# Altium footprint library PcbLib1.PcbLib: 136 footprints (part 7 of 9)
Each footprint in its own frame and in the unit in brackets; x right, y up, seen from the top. Pads: shape width x height; smd on the part's side, far side on the other; paste and mask are expansions set on the pad; w line width, h text height; cw(c..) or ccw(c..) is an arc to the next point about the centre after c.
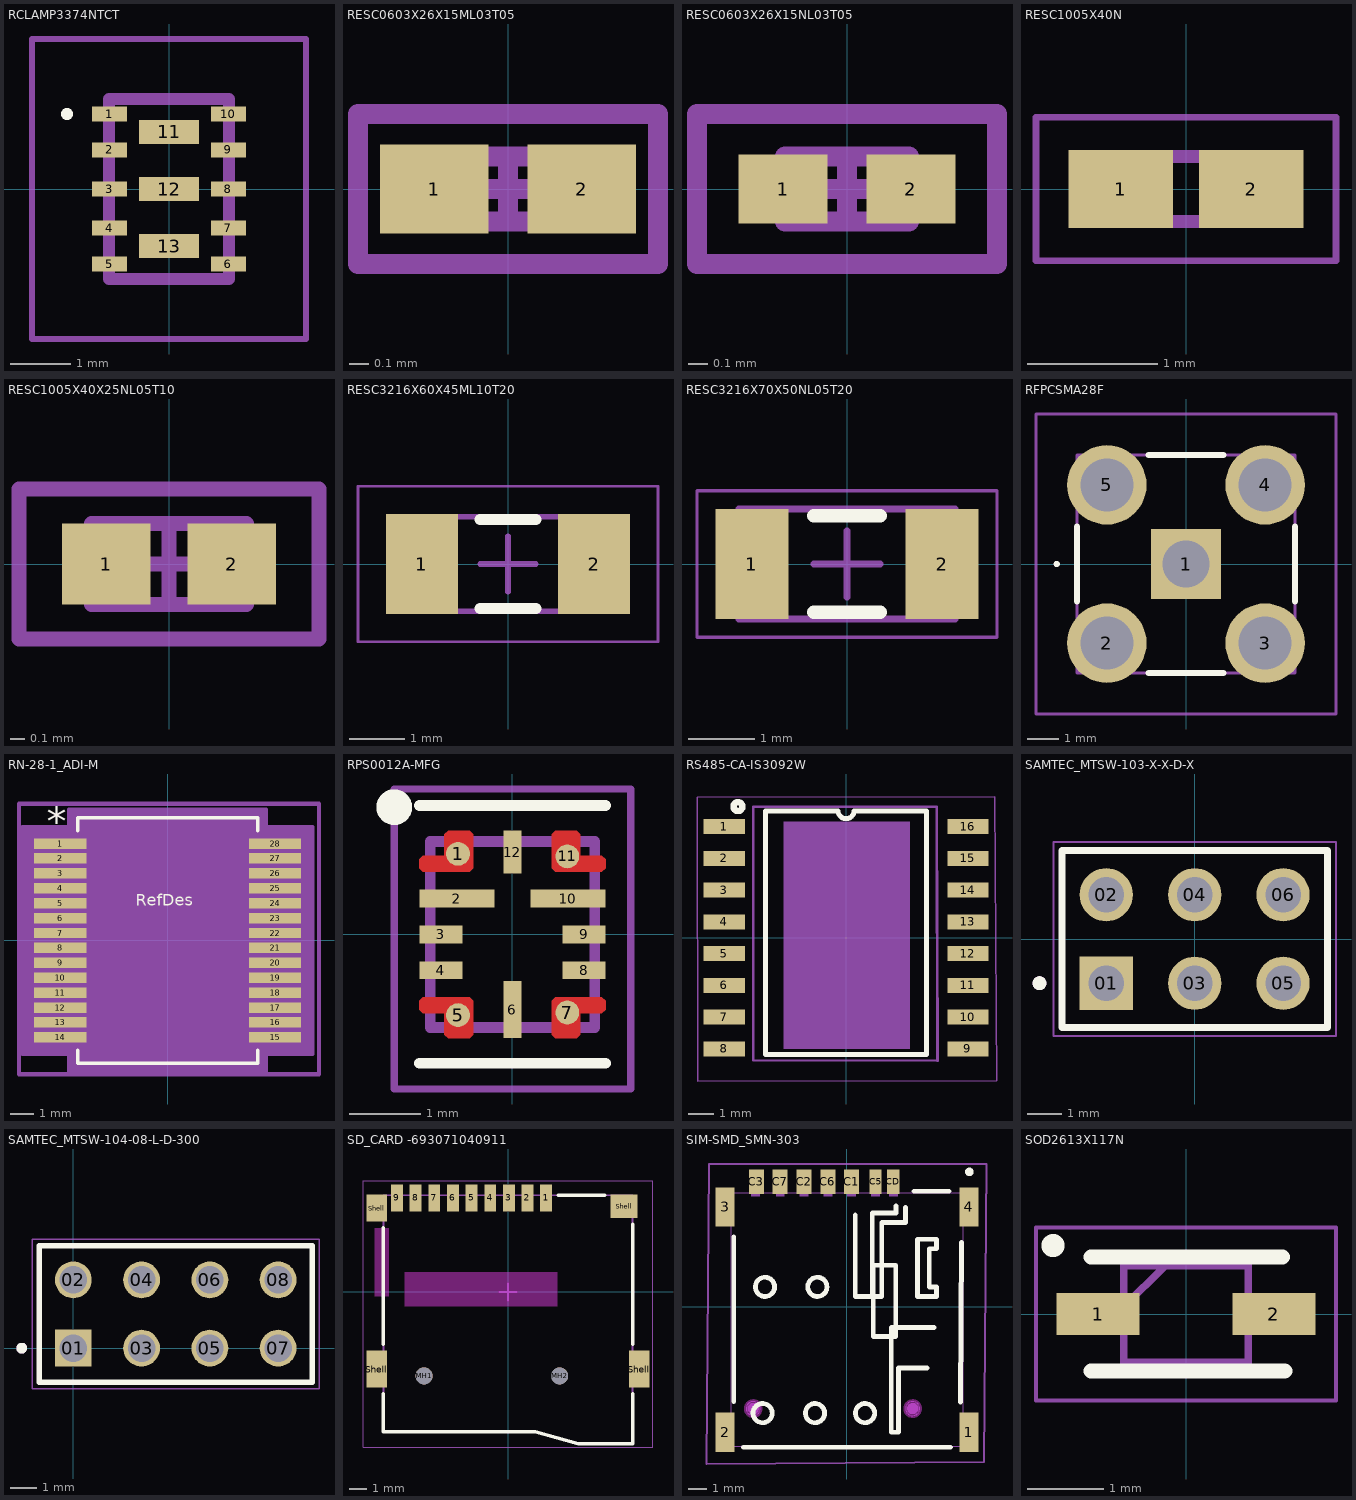
[diagram p6: the footprints below, top view; thin cyan lines are the x and y axes]

## RCLAMP3374NTCT [mm]
pads (13):
  rect 0.58x0.25 smd: 1(-0.99,1.25) 2(-0.99,0.65) 3(-0.99,0) 4(-0.99,-0.65) 5(-0.99,-1.25) 6(0.99,-1.25) 7(0.99,-0.65) 8(0.99,0) 9(0.99,0.65) 10(0.99,1.25)
  rect 1x0.4 smd: 11(0,0.95) 12(0,0) 13(0,-0.95)
Top Overlay:
  lines w0.1: -1.7,1.2 ccw(c-1.7,1.25) -1.7,1.3 ccw(c-1.7,1.25) -1.7,1.2
Mechanical 13:
  lines w0.2: -1,-1.5 1,-1.5 1,1.5 -1,1.5 -1,-1.5
Mechanical 15:
  lines w0.1: -2.28,-2.5 2.28,-2.5 2.28,2.5 -2.28,2.5 -2.28,-2.5
3D body "RCLAMP3374N.TCT.stp": height 0.61, standoff 0.01, extent -1,-1.5 1,1.5

## RESC0603X26X15ML03T05 [mm]
pads (2):
  rect 0.55x0.45 smd: 1(-0.375,0) 2(0.375,0)
Top Courtyard:
  lines w0.1: -0.165,0 0.165,0 ; 0,-0.165 0,0.165
Top 3D Body:
  lines w0.1: -0.315,-0.165 -0.315,0.165 0.315,0.165 0.315,-0.165 -0.315,-0.165
Mechanical 15:
  lines w0.101: -0.762,-0.381 0.762,-0.381 0.762,0.381 -0.762,0.381 -0.762,-0.381
3D body: height 0.26, standoff 0, extent -0.165,-0.165 0.165,0.165
3D body: height 0.26, standoff 0, extent -0.315,-0.165 -0.165,0.165
3D body: height 0.26, standoff 0, extent 0.165,-0.165 0.315,0.165

## RESC0603X26X15NL03T05 [mm]
pads (2):
  rect 0.45x0.35 smd: 1(-0.325,0) 2(0.325,0)
Top Courtyard:
  lines w0.1: -0.165,0 0.165,0 ; 0,-0.165 0,0.165
Top 3D Body:
  lines w0.1: -0.315,-0.165 0.315,-0.165 0.315,0.165 -0.315,0.165 -0.315,-0.165
Mechanical 15:
  lines w0.101: -0.762,-0.381 -0.762,0.381 0.762,0.381 0.762,-0.381 -0.762,-0.381
3D body: height 0.26, standoff 0, extent 0.165,-0.165 0.315,0.165
3D body: height 0.26, standoff 0, extent -0.315,-0.165 -0.165,0.165
3D body: height 0.26, standoff 0, extent -0.165,-0.165 0.165,0.165

## RESC1005X40N [mm]
pads (2):
  rect 0.8x0.6 smd: 1(-0.5,0) 2(0.5,0)
Mechanical 13:
  lines w0.1: -0.5,-0.25 0.5,-0.25 0.5,0.25 -0.5,0.25 -0.5,-0.25
Mechanical 15:
  lines w0.05: -1.15,-0.55 1.15,-0.55 1.15,0.55 -1.15,0.55 -1.15,-0.55
3D body "RMCF0402ZT0R00.stp": height 0.3, standoff 0, extent -0.504,-0.246 0.496,0.254

## RESC1005X40X25NL05T10 [mm]
pads (2):
  rect 0.6x0.55 smd: 1(-0.425,0) 2(0.425,0)
Top Courtyard:
  lines w0.1: -0.275,0 0.275,0 ; 0,-0.275 0,0.275
Top 3D Body:
  lines w0.1: -0.525,-0.275 -0.525,0.275 0.525,0.275 0.525,-0.275 -0.525,-0.275
Mechanical 15:
  lines w0.101: -1.016,-0.508 1.016,-0.508 1.016,0.508 -1.016,0.508 -1.016,-0.508
3D body: height 0.4, standoff 0, extent -0.275,-0.275 0.275,0.275
3D body: height 0.4, standoff 0, extent -0.525,-0.275 -0.275,0.275
3D body: height 0.4, standoff 0, extent 0.275,-0.275 0.525,0.275

## RESC3216X60X45ML10T20 [mm]
pads (2):
  rect 1.3x1.8 smd: 1(-1.55,0) 2(1.55,0)
Top Overlay:
  lines w0.2: -0.5,-0.8 0.5,-0.8 ; -0.5,0.8 0.5,0.8
Top Courtyard:
  lines w0.05: -2.7,-1.4 2.7,-1.4 2.7,1.4 -2.7,1.4 -2.7,-1.4
  lines w0.1: -0.5,0 0.5,0 ; 0,-0.5 0,0.5
Top 3D Body:
  lines w0.1: -1.65,-0.85 1.65,-0.85 1.65,0.85 -1.65,0.85 -1.65,-0.85
3D body: height 0.6, standoff 0, extent 1.2,-0.85 1.65,0.85
3D body: height 0.6, standoff 0, extent -1.65,-0.85 -1.2,0.85
3D body: height 0.6, standoff 0, extent -1.2,-0.85 1.2,0.85

## RESC3216X70X50NL05T20 [mm]
pads (2):
  rect 1.1x1.65 smd: 1(-1.425,0) 2(1.425,0)
Top Overlay:
  lines w0.2: -0.5,-0.725 0.5,-0.725 ; -0.5,0.725 0.5,0.725
Top Courtyard:
  lines w0.05: -2.25,-1.1 2.25,-1.1 2.25,1.1 -2.25,1.1 -2.25,-1.1
  lines w0.1: -0.5,0 0.5,0 ; 0,-0.5 0,0.5
Top 3D Body:
  lines w0.1: -1.625,-0.825 1.625,-0.825 1.625,0.825 -1.625,0.825 -1.625,-0.825
3D body: height 0.7, standoff 0, extent 1.125,-0.825 1.625,0.825
3D body: height 0.7, standoff 0, extent -1.625,-0.825 -1.125,0.825
3D body: height 0.7, standoff 0, extent -1.125,-0.825 1.125,0.825

## RFPCSMA28F [mm]
pads (5):
  rect 2.25x2.25 hole 1.5: 1(0,0)
  round 2.55 hole 1.7: 2(-2.54,-2.54) 3(2.54,-2.54) 4(2.54,2.54) 5(-2.54,2.54)
Top Overlay:
  lines w0.1: -4.2,0 cw(c-4.15,0) -4.1,0 cw(c-4.15,0) -4.2,0
  lines w0.2: -3.5,-1.2 -3.5,1.2 ; -1.2,-3.5 1.2,-3.5 ; -1.2,3.5 1.2,3.5 ; 3.5,-1.2 3.5,1.2
Mechanical 13:
  lines w0.1: -3.5,-3.5 -3.5,3.5 3.5,3.5 3.5,-3.5 -3.5,-3.5
Mechanical 15:
  lines w0.1: -4.815,-4.815 -4.815,4.815 4.815,4.815 4.815,-4.815 -4.815,-4.815
3D body "RFPC-SMA28-F_1.0.STEP": height 9.57, standoff -3.93, extent -3.627,-3.754 3.373,3.246

## RN-28-1_ADI-M [mil]
pads (28):
  rect 90x18 smd paste+0 mask+0: 1(-184.5,166.34) 2(-184.5,140.75) 3(-184.5,115.16) 4(-184.5,89.57) 5(-184.5,63.98) 6(-184.5,38.39) 7(-184.5,12.8) 8(-184.5,-12.8) 9(-184.5,-38.39) 10(-184.5,-63.98) 11(-184.5,-89.57) 12(-184.5,-115.16) 13(-184.5,-140.75) 14(-184.5,-166.34) 15(184.5,-166.34) 16(184.5,-140.75) 17(184.5,-115.16) 18(184.5,-89.57) 19(184.5,-63.98) 20(184.5,-38.39) 21(184.5,-12.8) 22(184.5,12.8) 23(184.5,38.39) 24(184.5,63.98) 25(184.5,89.57) 26(184.5,115.16) 27(184.5,140.75) 28(184.5,166.34)
Top Overlay:
  lines w6: -154.5,-188.44 -154.5,-210.5 154.5,-210.5 154.5,-188.44 ; -154.5,188.44 -154.5,210.5 154.5,210.5 154.5,188.44
  text "RefDes" at -55,60 h20
  text "*" at -207,179.34 h50
Mechanical 1:
  lines w7.68: -255,-230 -255,210 -255,235 260,235 260,-230 -255,-230
Mechanical 13:
  lines w0: -12,205.5 ccw(c0,205.5) 12,205.5
  lines w1: -207.5,-174.34 -149.5,-174.34 -149.5,-158.34 -207.5,-158.34 -207.5,-174.34 ; -207.5,-148.75 -149.5,-148.75 -149.5,-132.75 -207.5,-132.75 -207.5,-148.75 ; -207.5,-123.16 -149.5,-123.16 -149.5,-107.16 -207.5,-107.16 -207.5,-123.16 ; -207.5,-97.57 -149.5,-97.57 -149.5,-81.57 -207.5,-81.57 -207.5,-97.57 ; -207.5,-71.98 -149.5,-71.98 -149.5,-55.98 -207.5,-55.98 -207.5,-71.98 ; -207.5,-46.39 -149.5,-46.39 -149.5,-30.39 -207.5,-30.39 -207.5,-46.39 ; -207.5,-20.8 -149.5,-20.8 -149.5,-4.8 -207.5,-4.8 -207.5,-20.8 ; -207.5,4.8 -149.5,4.8 -149.5,20.8 -207.5,20.8 -207.5,4.8 ; -207.5,30.39 -149.5,30.39 -149.5,46.39 -207.5,46.39 -207.5,30.39 ; -207.5,55.98 -149.5,55.98 -149.5,71.98 -207.5,71.98 -207.5,55.98 ; -207.5,81.57 -149.5,81.57 -149.5,97.57 -207.5,97.57 -207.5,81.57 ; -207.5,107.16 -149.5,107.16 -149.5,123.16 -207.5,123.16 -207.5,107.16 ; -207.5,132.75 -149.5,132.75 -149.5,148.75 -207.5,148.75 -207.5,132.75 ; -207.5,158.34 -149.5,158.34 -149.5,174.34 -207.5,174.34 -207.5,158.34 ; -149.5,-205.5 -149.5,205.5 149.5,205.5 149.5,-205.5 -149.5,-205.5 ; 149.5,-174.34 207.5,-174.34 207.5,-158.34 149.5,-158.34 149.5,-174.34 ; 149.5,-148.75 207.5,-148.75 207.5,-132.75 149.5,-132.75 149.5,-148.75 ; 149.5,-123.16 207.5,-123.16 207.5,-107.16 149.5,-107.16 149.5,-123.16 ; 149.5,-97.57 207.5,-97.57 207.5,-81.57 149.5,-81.57 149.5,-97.57 ; 149.5,-71.98 207.5,-71.98 207.5,-55.98 149.5,-55.98 149.5,-71.98 ; 149.5,-46.39 207.5,-46.39 207.5,-30.39 149.5,-30.39 149.5,-46.39 ; 149.5,-20.8 207.5,-20.8 207.5,-4.8 149.5,-4.8 149.5,-20.8 ; 149.5,4.8 207.5,4.8 207.5,20.8 149.5,20.8 149.5,4.8 ; 149.5,30.39 207.5,30.39 207.5,46.39 149.5,46.39 149.5,30.39 ; 149.5,55.98 207.5,55.98 207.5,71.98 149.5,71.98 149.5,55.98 ; 149.5,81.57 207.5,81.57 207.5,97.57 149.5,97.57 149.5,81.57 ; 149.5,107.16 207.5,107.16 207.5,123.16 149.5,123.16 149.5,107.16 ; 149.5,132.75 207.5,132.75 207.5,148.75 149.5,148.75 149.5,132.75 ; 149.5,158.34 207.5,158.34 207.5,174.34 149.5,174.34 149.5,158.34
  text "*" at -147,152.5 h50
Mechanical 15:
  region: -169.5,-195.34 -249.5,-195.34 -249.5,195.34 -169.5,195.34 -169.5,225.5 169.5,225.5 169.5,195.34 249.5,195.34 249.5,-195.34 169.5,-195.34 169.5,-225.5 -169.5,-225.5
  lines w6: -249.5,-195.34 -169.5,-195.34 -169.5,-225.5 169.5,-225.5 169.5,-195.34 249.5,-195.34 249.5,195.34 169.5,195.34 169.5,225.5 -169.5,225.5 -169.5,195.34 -249.5,195.34 -249.5,-195.34
3D body "RN-28-1_ADI.step": height 104.09, standoff 0, extent -207.52,-205.51 207.52,205.51

## RPS0012A-MFG [mm]
pads (12):
  round 0.332 smd paste+0 mask+0: 1(-0.761,1.127) 5(-0.761,-1.127) 7(0.766,-1.091) 11(0.766,1.091)
  rect 1.05x0.25 smd paste+0 mask+0: 2(-0.775,0.5) 10(0.775,0.5)
  rect 0.6x0.25 smd paste+0 mask+0: 3(-1,0) 4(-1,-0.5) 8(1,-0.5) 9(1,0)
  rect 0.25x0.8 smd paste+0 mask+0: 6(0,-1.05)
  rect 0.25x0.6 smd paste+0 mask+0: 12(0,1.15)
Top Layer:
  region: 1.3,1.05 1.25,1.1 0.95,1.1 0.95,1.4 0.9,1.45 0.6,1.45 0.55,1.4 0.55,0.925 0.6,0.875 1.25,0.875 1.3,0.925
  region: 1.3,-1.05 1.25,-1.1 0.95,-1.1 0.95,-1.4 0.9,-1.45 0.6,-1.45 0.55,-1.4 0.55,-0.925 0.6,-0.875 1.25,-0.875 1.3,-0.925
  region: -1.3,-1.05 -1.25,-1.1 -0.95,-1.1 -0.95,-1.4 -0.9,-1.45 -0.6,-1.45 -0.55,-1.4 -0.55,-0.925 -0.6,-0.875 -1.25,-0.875 -1.3,-0.925
  region: -1.3,1.05 -1.25,1.1 -0.95,1.1 -0.95,1.4 -0.9,1.45 -0.6,1.45 -0.55,1.4 -0.55,0.925 -0.6,0.875 -1.25,0.875 -1.3,0.925
Top Overlay:
  circle w0.25: c-1.651,1.778 r0.125
  lines w0.15: -1.3,-1.8 1.3,-1.8 ; -1.3,1.8 1.3,1.8
Top Paste:
  region: 0.95,1.1 1.25,1.1 1.3,1.05 1.3,0.925 1.25,0.875 0.6,0.875 0.55,0.925 0.55,1.4 0.6,1.45 0.9,1.45 0.95,1.4
  region: 1.3,-1.05 1.25,-1.1 0.95,-1.1 0.95,-1.4 0.9,-1.45 0.6,-1.45 0.55,-1.4 0.55,-0.925 0.6,-0.875 1.25,-0.875 1.3,-0.925
  region: -0.95,-1.1 -1.25,-1.1 -1.3,-1.05 -1.3,-0.925 -1.25,-0.875 -0.6,-0.875 -0.55,-0.925 -0.55,-1.4 -0.6,-1.45 -0.9,-1.45 -0.95,-1.4
  region: -1.3,1.05 -1.25,1.1 -0.95,1.1 -0.95,1.4 -0.9,1.45 -0.6,1.45 -0.55,1.4 -0.55,0.925 -0.6,0.875 -1.25,0.875 -1.3,0.925
Top Solder:
  region: 0.95,1.1 1.25,1.1 1.3,1.05 1.3,0.925 1.25,0.875 0.6,0.875 0.55,0.925 0.55,1.4 0.6,1.45 0.9,1.45 0.95,1.4
  region: 1.3,-1.05 1.25,-1.1 0.95,-1.1 0.95,-1.4 0.9,-1.45 0.6,-1.45 0.55,-1.4 0.55,-0.925 0.6,-0.875 1.25,-0.875 1.3,-0.925
  region: -0.95,-1.1 -1.25,-1.1 -1.3,-1.05 -1.3,-0.925 -1.25,-0.875 -0.6,-0.875 -0.55,-0.925 -0.55,-1.4 -0.6,-1.45 -0.9,-1.45 -0.95,-1.4
  region: -1.3,1.05 -1.25,1.1 -0.95,1.1 -0.95,1.4 -0.9,1.45 -0.6,1.45 -0.55,1.4 -0.55,0.925 -0.6,0.875 -1.25,0.875 -1.3,0.925
Mechanical 13:
  lines w0.15: -1.15,-1.3 -1.15,1.3 1.15,1.3 1.15,-1.3 -1.15,-1.3
Mechanical 15:
  lines w0.101: -1.651,-2.159 -1.651,2.032 1.651,2.032 1.651,-2.159 -1.651,-2.159

## RS485-CA-IS3092W [mm] "RS485-INTEGRATED IC"
pads (16):
  rect 1.65x0.6 smd: 1(-4.875,4.445) 2(-4.875,3.175) 3(-4.875,1.905) 4(-4.875,0.635) 5(-4.875,-0.635) 6(-4.875,-1.905) 7(-4.875,-3.175) 8(-4.875,-4.445) 9(4.875,-4.445) 10(4.875,-3.175) 11(4.875,-1.905) 12(4.875,-0.635) 13(4.875,0.635) 14(4.875,1.905) 15(4.875,3.175) 16(4.875,4.445)
Top Overlay:
  circle w0.254: c-4.325,5.25 r0.18
  lines w0.2: -3.215,-4.68 3.215,-4.68 3.215,5.08 0.318,5.08 cw(c0,5.08) -0.318,5.08 -3.215,5.08 -3.215,-4.68
Mechanical 1:
  rectangle: -2.5,-4.45 2.55,4.65
Mechanical 13:
  lines w0.101: -3.713,-4.907 3.659,-4.927 3.634,5.245 -3.713,5.245 -3.713,-4.907
Mechanical 15:
  lines w0.05: -5.965,5.621 -5.941,-5.743 6.041,-5.718 5.944,5.645 -5.965,5.621

## SAMTEC_MTSW-103-X-X-D-X [mm]
pads (6):
  rect 1.53x1.53 / inner round 1.53 / far side rect 1.53x1.53 hole 1.02: 01(-2.54,-1.27)
  round 1.53 hole 1.02: 02(-2.54,1.27) 03(0,-1.27) 04(0,1.27) 05(2.54,-1.27) 06(2.54,1.27)
Top Overlay:
  circle w0.2: c-4.46,-1.27 r0.1
  lines w0.2: -3.81,-2.54 -3.81,2.54 3.81,2.54 3.81,-2.54 -3.81,-2.54
Mechanical 13:
  circle w0.2: c-4.46,-1.27 r0.1
  lines w0.1: -3.81,-2.54 3.81,-2.54 3.81,2.54 -3.81,2.54 -3.81,-2.54
Mechanical 15:
  lines w0.05: -4.06,-2.79 -4.06,2.79 4.06,2.79 4.06,-2.79 -4.06,-2.79

## SAMTEC_MTSW-104-08-L-D-300 [mm]
pads (8):
  rect 1.37x1.37 hole 1.02: 01(0,0)
  round 1.37 hole 1.02: 02(0,2.54) 03(2.54,0) 04(2.54,2.54) 05(5.08,0) 06(5.08,2.54) 07(7.62,0) 08(7.62,2.54)
Top Overlay:
  circle w0.2: c-1.92,0 r0.1
  lines w0.2: -1.27,-1.27 -1.27,3.81 8.89,3.81 8.89,-1.27 -1.27,-1.27
Mechanical 13:
  circle w0.2: c-1.92,0 r0.1
  lines w0.1: -1.27,-1.27 -1.27,3.81 8.89,3.81 8.89,-1.27 -1.27,-1.27
Mechanical 15:
  lines w0.05: -1.52,-1.52 -1.52,4.06 9.14,4.06 9.14,-1.52 -1.52,-1.52

## SD_CARD -693071040911 [mm] "MicroSD push-push CD SMT"
height 1.85
pads (15):
  rect 0.7x1.6 smd: 1(2.25,5.55) 2(1.15,5.55) 3(0.05,5.55) 4(-1.05,5.55) 5(-2.15,5.55) 6(-3.25,5.55) 7(-4.35,5.55) 8(-5.45,5.55) 9(-6.55,5.55)
  round 1 hole 1 unplated: MH1(-4.95,-4.95) MH2(3.05,-4.95)
  rect 1.2x2.2 smd: Shell(-7.75,-4.55) Shell(7.75,-4.55)
  rect 1.2x1.6 smd: Shell(-7.75,4.95)
  rect 1.6x1.4 smd: Shell(6.85,5.05)
Top Layer keep-out:
  region: -7.05,3.75 -7.85,3.75 -7.85,-0.25 -7.05,-0.25
  region: -6.1,1.15 2.9,1.15 2.9,-0.85 -6.1,-0.85
Top Overlay:
  lines w0.2: -7.35,-6 -7.35,-8.25 1.6,-8.25 4.15,-8.95 7.35,-8.95 7.35,-6 ; -7.35,-3.1 -7.35,3.8 ; 2.95,5.7 5.7,5.7 ; 7.35,-3.1 7.35,4
Top Courtyard:
  lines w0.05: -8.55,-9.15 -8.55,6.55 8.55,6.55 8.55,-9.15 -8.55,-9.15
Top 3D Body:
  lines w0.1: -7.35,-8.25 -7.35,5.7 7.35,5.7 7.35,-8.95 4.15,-8.95 1.6,-8.25 -7.35,-8.25
Top Assembly:
  lines w0.1: -7.35,-8.25 -7.35,5.7 7.35,5.7 7.35,-8.95 4.15,-8.95 1.6,-8.25 -7.35,-8.25
Top Designator:
  text ".Designator" at -3.647,-0.357 h1
Top Component Center:
  lines w0.1: -0.5,0 0.5,0 ; 0,-0.5 0,0.5
3D body "693071040911.stp": height 1.9, standoff -0.55, extent -8.05,-8.95 8.05,6.05

## SIM-SMD_SMN-303 [mm]
pads (11):
  rect 1x2.1 smd: 1(6.5,-6.672) 2(-6.5,-6.672) 3(-6.5,5.328) 4(6.5,5.328)
  rect 0.8x1.3 smd: C1(0.25,6.672) C2(-2.29,6.672) C3(-4.83,6.672) C6(-1.02,6.672) C7(-3.56,6.672)
  rect 0.65x1.3 smd: C5(1.52,6.672) CD(2.47,6.672)
Top Overlay:
  circle w0.254: c6.525,7.2 r0.103
  circle w0.254: c0.962,-5.663 r0.512
  circle w0.254: c-1.705,-5.663 r0.512
  circle w0.254: c-4.499,-5.663 r0.512
  circle w0.254: c-1.578,1.068 r0.512
  circle w0.254: c-4.372,1.068 r0.512
  lines w0.254: -6.042,-5.062 -6.042,3.738 ; -5.527,-7.486 5.518,-7.486 ; 0.436,4.901 0.436,0.56 1.851,0.56 1.851,4.497 3.121,4.497 3.121,5.315 ; 1.343,0.56 1.343,5.005 2.613,5.005 2.613,5.376 ; 3.569,6.164 5.437,6.161 ; 4.264,-3.25 2.74,-3.25 2.74,-6.679 2.359,-6.679 2.359,-1.091 4.645,-1.091 ; 6.046,-5.076 6.11,3.443 ; 1.4,-1.572 1.4,2.228 2.6,2.228 2.6,-1.572 1.4,-1.572 ; 3.756,0.56 4.772,0.56 4.772,1.068 4.391,1.068 4.391,3.1 4.772,3.1 4.772,3.608 3.756,3.608 3.756,0.56
Keep-Out Layer:
  board cut-out: 3.875,-5.422 3.875,-5.348 3.818,-5.21 3.712,-5.104 3.575,-5.047 3.425,-5.047 3.288,-5.104 3.182,-5.21 3.125,-5.348 3.125,-5.422 3.125,-5.497 3.182,-5.635 3.288,-5.74 3.425,-5.797 3.575,-5.797 3.713,-5.74 3.818,-5.635 3.875,-5.497 3.875,-5.422
  board cut-out: -4.625,-5.422 -4.625,-5.348 -4.682,-5.21 -4.787,-5.104 -4.925,-5.047 -5.074,-5.047 -5.212,-5.104 -5.318,-5.21 -5.375,-5.348 -5.375,-5.422 -5.375,-5.497 -5.318,-5.635 -5.212,-5.74 -5.074,-5.797 -4.925,-5.797 -4.787,-5.74 -4.682,-5.635 -4.625,-5.497 -4.625,-5.422
Mechanical 1:
  circle w0.005: c3.5,-5.422 r0.375
  circle w0.005: c-5,-5.422 r0.375
Top Courtyard:
  region: 0.025,7.128 0.475,7.128 0.475,5.9 0.025,5.9
  region: -1.245,7.128 -0.795,7.128 -0.795,5.9 -1.245,5.9
  region: -2.515,7.128 -2.065,7.128 -2.065,5.9 -2.515,5.9
  region: 6.15,6.078 6.7,6.078 6.7,4.578 6.15,4.578
  region: 6.15,-5.922 6.7,-5.922 6.7,-7.422 6.15,-7.422
  region: -6.7,-5.922 -6.15,-5.922 -6.15,-7.422 -6.7,-7.422
  region: -6.7,6.078 -6.15,6.078 -6.15,4.578 -6.7,4.578
  region: -5.1,7.128 -4.65,7.128 -4.65,5.9 -5.1,5.9
  region: -3.785,7.128 -3.335,7.128 -3.335,5.9 -3.785,5.9
  region: 1.295,7.128 1.745,7.128 1.745,5.9 1.295,5.9
  region: 2.245,7.128 2.695,7.128 2.695,5.9 2.245,5.9
  lines w0.051: -6.206,-7.422 6.206,-7.422 6.206,6.078 -6.206,6.078 -6.206,-7.422
Mechanical 6:
  circle w0.3: c3.5,-5.422 r0.15
  circle w0.3: c-5,-5.422 r0.15
Mechanical 15:
  lines w0.101: -7.493,-8.375 7.309,-8.258 7.436,7.62 -7.366,7.62 -7.493,-8.375
Multi-Layer keep-out:
  circle w0.254: c3.5,-5.422 r0.375
  circle w0.254: c-5,-5.422 r0.375

## SOD2613X117N [mm]
pads (2):
  rect 1.088x0.55 smd: 1(-1.158,0) 2(1.158,0)
Top Overlay:
  circle w0.254: c-1.75,0.9 r0.025
  lines w0.2: -1.25,-0.75 1.3,-0.75 ; -1.25,0.75 1.271,0.75
Mechanical 13:
  lines w0.1: -0.82,0.094 -0.276,0.638 ; -0.82,-0.638 0.82,-0.638 0.82,0.638 -0.82,0.638 -0.82,-0.638
Mechanical 15:
  lines w0.05: -1.975,-1.14 1.975,-1.14 1.975,1.14 -1.975,1.14 -1.975,-1.14
3D body "UCLAMP3301D.TCT.stp": height 1.17, standoff 0, extent -1.295,-0.637 1.295,0.637